# Altium footprint library Inductor.PcbLib: 39 footprints (part 1 of 3)
Each footprint in its own frame and in the unit in brackets; x right, y up, seen from the top. Pads: shape width x height; smd on the part's side, far side on the other; paste and mask are expansions set on the pad; w line width, h text height; cw(c..) or ccw(c..) is an arc to the next point about the centre after c.
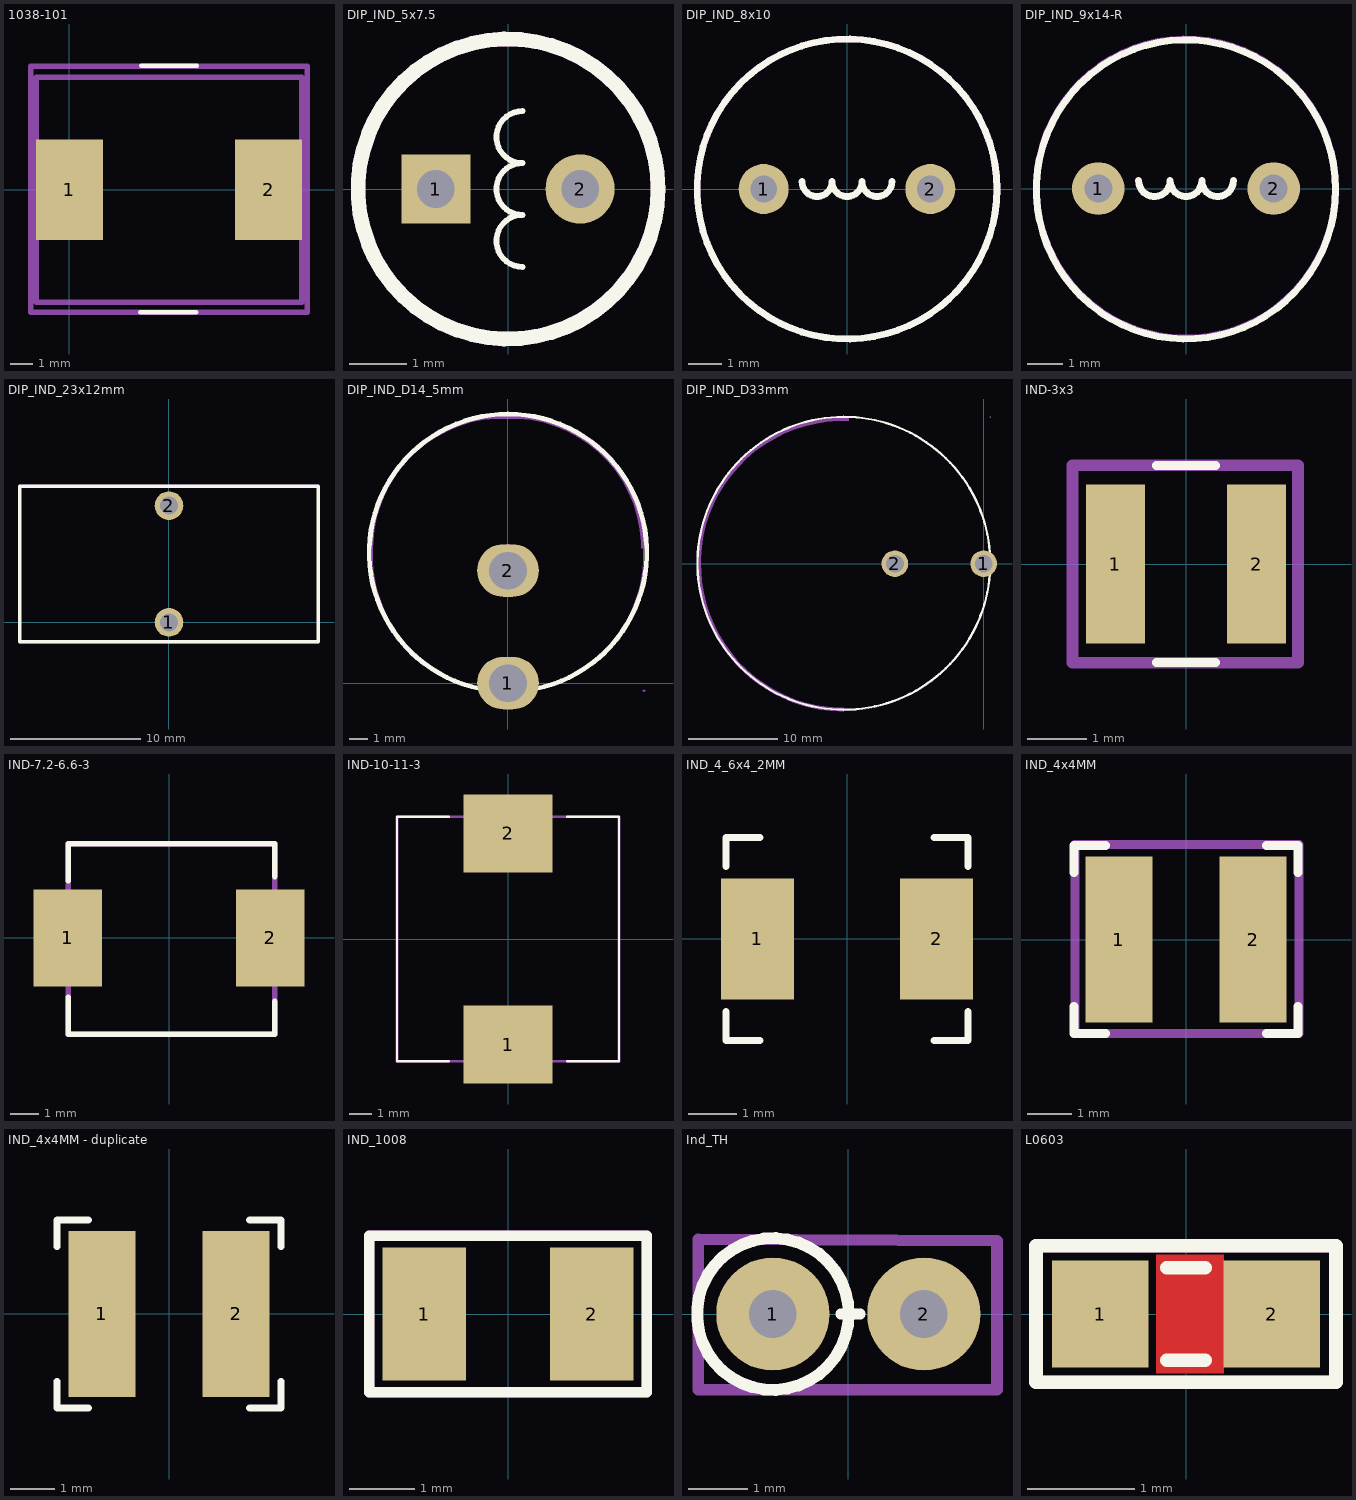
[diagram p0: the footprints below, top view; thin cyan lines are the x and y axes]

## 1038-101 [mm] "FIXED IND 1.5UH 4.2A 20.8 MOHM"
pads (2):
  rect 3x4.5 smd: 1(-0.001,0) 2(8.9,0)
Top Overlay:
  lines w0.2: 3.175,-5.475 5.675,-5.475 ; 3.2,5.55 5.7,5.55
Mechanical 13:
  lines w0.254: -1.725,-5.475 10.625,-5.475 10.625,5.525 -1.725,5.525 -1.725,-5.475
  text ".Designator" at -0.572,-0.635 h1.5
Mechanical 15:
  lines w0.254: -1.475,-5.025 10.375,-5.025 10.375,5.025 -1.475,5.025 -1.475,-5.025
  text ".Comment" at -0.572,-0.635 h1.5
3D body "SRP6540.stp": height 3.97, standoff -0.02, extent 0.731,-3.126 7.919,3.376

## DIP_IND_5x7.5 [mm]
height 8
pads (2):
  rect 1.2x1.2 hole 0.65: 1(-1.25,0)
  round 1.2 hole 0.65: 2(1.25,0)
Top Overlay:
  circle w0.254: c0,0 r2.6
  lines w0.1: 0.25,-1.35 cw(c0.249,-0.9) 0.25,-0.45 cw(c0.249,0) 0.25,0.45 cw(c0.249,0.9) 0.25,1.35
Mechanical 13:
  circle w0.254: c0,0 r2.6
  text ".Designator" at 0.204,-2.243 h1
Mechanical 15:
  circle w0.254: c0,0 r2.6
  text ".Comment" at 0.204,-2.116 h1
3D body "IND5x7.stp": height 7.5, standoff -28.5, extent -2.75,-2.75 2.75,2.75

## DIP_IND_8x10 [mm]
height 8
pads (2):
  round 1.5 hole 0.8: 1(-2.5,0) 2(2.5,0)
Top Overlay:
  circle w0.2: c0,0 r4.5
  lines w0.2: -1.35,0.225 ccw(c-0.9,0.224) -0.45,0.225 ccw(c0,0.224) 0.45,0.225 ccw(c0.9,0.224) 1.35,0.225
Mechanical 13:
  circle w0.2: c0,0 r4.5
  text ".Designator" at -3.725,-0.325 h1.5
Mechanical 15:
  circle w0.2: c0,0 r4.5
  text ".Comment" at -4.2,-0.45 h1.5
3D body: height 10, standoff 6.6, extent -4.49,-4.49 4.49,4.49
3D body: height 6.6, standoff 3.3, extent -3.903,-3.907 3.903,3.907
3D body: height 3.3, standoff 0, extent -4.49,-4.49 4.49,4.49

## DIP_IND_9x14-R [mm]
height 8
pads (2):
  round 1.5 hole 0.8: 1(-2.5,0) 2(2.5,0)
Top Overlay:
  circle w0.2: c0,-0.025 r4.264
  lines w0.2: -1.35,0.225 ccw(c-0.9,0.224) -0.45,0.225 ccw(c0,0.224) 0.45,0.225 ccw(c0.9,0.224) 1.35,0.225
Mechanical 13:
  circle w0.2: c0,0 r4.264
  text ".Designator" at -3.725,-0.325 h1.5
3D body "rlb0914.stp": height 11.14, standoff -21, extent -4.199,-4.146 4.195,4.25

## DIP_IND_23x12mm [mm]
pads (2):
  round 2.2 hole 1.4 paste+0 mask+0.05: 1(0,0) 2(0,9)
Top Overlay:
  lines w0.254: -11.5,-1.5 -11.5,10.5 11.5,10.5 11.5,-1.5 -11.5,-1.5
Mechanical 6:
  region: -11.43,10.596 -11.43,-1.469 11.43,-1.469 11.43,10.469 -11.303,10.469 -11.303,10.596 11.557,10.596 11.557,-1.596 -11.557,-1.596 -11.557,10.596
Mechanical 15:
  region: 11.56,-1.5 11.56,-1.475 11.525,-1.44 11.475,-1.44 11.44,-1.475 11.44,-1.5 11.44,-1.525 11.475,-1.56 11.525,-1.56 11.56,-1.525
  region: 0.6,9 0.599,9.118 0.507,9.337 0.338,9.504 0.119,9.594 -0.119,9.594 -0.338,9.504 -0.507,9.337 -0.599,9.119 -0.6,9 -0.599,8.881 -0.507,8.663 -0.338,8.496 -0.119,8.405 0.119,8.405 0.338,8.496 0.507,8.663 0.599,8.881
  region: 0.6,0 0.599,0.118 0.507,0.337 0.338,0.504 0.119,0.594 -0.119,0.594 -0.338,0.504 -0.507,0.337 -0.599,0.119 -0.6,0 -0.599,-0.119 -0.507,-0.337 -0.338,-0.504 -0.119,-0.595 0.119,-0.595 0.338,-0.504 0.507,-0.337 0.599,-0.119
  lines w0.051: -11.5,-1.5 -11.5,10.5 11.5,10.5 11.5,-1.5 -11.5,-1.5
3D body "3D.step": height 25.91, standoff -3.4, extent -11.392,-1.5 11.292,10.6

## DIP_IND_D14_5mm [mm]
pads (2):
  oval 3.3x2.8 hole 2 paste+0 mask+0.05: 1(0,0) 2(0,6)
Top Overlay:
  lines w0.254: -0.998,-0.387 cw(c0,6.945) 0.998,-0.387
Mechanical 6:
  region: 7.3,7.2 7.3,7.549 7.232,8.243 7.096,8.927 6.893,9.595 6.626,10.239 6.297,10.855 5.91,11.435 5.467,11.974 4.974,12.467 4.435,12.91 3.855,13.297 3.239,13.626 2.595,13.893 1.927,14.096 1.243,14.232 0.549,14.3 0.2,14.3 -0.3,14.3 -0.649,14.3 -1.343,14.232 -2.027,14.096 -2.695,13.893 -3.339,13.626 -3.955,13.297 -4.535,12.91 -5.074,12.467 -5.567,11.974 -6.01,11.435 -6.397,10.855 -6.726,10.239 -6.993,9.595 -7.196,8.927 -7.332,8.243 -7.4,7.549 -7.4,7.2 -7.2,7.2 -7.192,7.539 -7.125,8.212 -6.993,8.877 -6.797,9.525 -6.538,10.15 -6.218,10.747 -5.842,11.31 -5.413,11.834 -4.934,12.313 -4.41,12.742 -3.847,13.118 -3.25,13.438 -2.625,13.697 -1.977,13.893 -1.312,14.025 -0.639,14.092 -0.3,14.1 0.2,14.1 0.539,14.092 1.212,14.025 1.877,13.893 2.525,13.697 3.15,13.438 3.747,13.118 4.31,12.742 4.834,12.313 5.313,11.834 5.742,11.31 6.118,10.747 6.438,10.15 6.697,9.525 6.893,8.877 7.025,8.212 7.092,7.539 7.1,7.2
Mechanical 15:
  region: 0.4,0 0.398,0.079 0.336,0.223 0.224,0.333 0.079,0.393 -0.079,0.393 -0.224,0.333 -0.336,0.223 -0.398,0.079 -0.4,0 -0.398,-0.079 -0.336,-0.223 -0.224,-0.333 -0.078,-0.393 0.079,-0.393 0.224,-0.333 0.336,-0.223 0.399,-0.078
  region: 0.4,7 0.398,7.079 0.336,7.223 0.224,7.333 0.078,7.393 -0.079,7.393 -0.224,7.333 -0.337,7.223 -0.399,7.079 -0.4,7 -0.399,6.921 -0.336,6.777 -0.224,6.667 -0.079,6.607 0.079,6.607 0.224,6.667 0.336,6.777 0.398,6.922
  region: 7.311,-0.405 7.31,-0.381 7.275,-0.347 7.226,-0.347 7.191,-0.381 7.191,-0.405 7.191,-0.429 7.226,-0.463 7.275,-0.463 7.31,-0.429
  lines w0.051: -7.25,6.945 cw(c-0.001,7.045) 0,14.295 cw(c0.001,7.045) 7.25,6.945 cw(c0.001,6.845) 0,-0.405 cw(c-0.001,6.845) -7.25,6.945
3D body "3.step": height 9.55, standoff -2.9, extent -7.4,-0.325 7.3,14.385

## DIP_IND_D33mm [mm]
pads (2):
  round 3 hole 2 paste+0 mask+0.05: 1(0,0) 2(-10,0)
Top Overlay:
  lines w0.254: 0.7,-1.1 cw(c-15.755,0.05) 0.7,1.2
Mechanical 6:
  region: -31.85,-0.15 -31.838,-0.782 -31.738,-2.042 -31.541,-3.291 -31.245,-4.52 -30.855,-5.722 -30.371,-6.89 -29.797,-8.017 -29.137,-9.095 -28.394,-10.117 -27.573,-11.079 -26.679,-11.973 -25.717,-12.794 -24.695,-13.537 -23.617,-14.197 -22.49,-14.771 -21.322,-15.255 -20.12,-15.645 -18.891,-15.941 -17.642,-16.138 -16.382,-16.238 -15.75,-16.25 -15.75,-16.65 -16.29,-16.65 -17.368,-16.579 -18.439,-16.438 -19.499,-16.228 -20.542,-15.948 -21.565,-15.601 -22.563,-15.187 -23.532,-14.709 -24.468,-14.169 -25.366,-13.569 -26.223,-12.911 -27.035,-12.199 -27.799,-11.435 -28.511,-10.623 -29.169,-9.766 -29.769,-8.868 -30.309,-7.932 -30.787,-6.963 -31.201,-5.965 -31.548,-4.942 -31.828,-3.899 -32.038,-2.839 -32.179,-1.768 -32.25,-0.69 -32.25,-0.15 -32.25,0.45 -31.85,0.45
  region: -15.8,16.1 -16.432,16.088 -17.692,15.988 -18.941,15.791 -20.17,15.495 -21.372,15.105 -22.54,14.621 -23.667,14.047 -24.745,13.387 -25.767,12.644 -26.729,11.823 -27.623,10.929 -28.444,9.967 -29.187,8.945 -29.847,7.867 -30.421,6.74 -30.905,5.572 -31.295,4.37 -31.591,3.141 -31.788,1.892 -31.888,0.632 -31.9,0 -32.3,0 -32.3,0.54 -32.229,1.618 -32.088,2.689 -31.878,3.749 -31.598,4.792 -31.251,5.815 -30.837,6.813 -30.359,7.782 -29.819,8.718 -29.219,9.616 -28.561,10.473 -27.849,11.285 -27.085,12.049 -26.273,12.761 -25.416,13.419 -24.518,14.019 -23.582,14.559 -22.613,15.037 -21.615,15.451 -20.592,15.798 -19.549,16.078 -18.489,16.288 -17.418,16.429 -16.34,16.5 -15.8,16.5 -15.2,16.5 -15.2,16.1
Mechanical 15:
  region: 0.81,16.52 0.809,16.545 0.774,16.578 0.726,16.578 0.691,16.545 0.69,16.52 0.691,16.496 0.726,16.463 0.774,16.463 0.809,16.496
  region: -9.25,0 -9.25,0.099 -9.301,0.29 -9.4,0.461 -9.539,0.6 -9.711,0.699 -9.901,0.75 -10.099,0.75 -10.29,0.699 -10.461,0.6 -10.6,0.461 -10.699,0.29 -10.75,0.099 -10.75,0 -10.75,-0.099 -10.699,-0.29 -10.6,-0.461 -10.461,-0.6 -10.29,-0.699 -10.099,-0.75 -9.901,-0.75 -9.711,-0.699 -9.539,-0.6 -9.4,-0.461 -9.301,-0.29 -9.25,-0.099
  region: 0.75,0 0.75,0.099 0.699,0.29 0.6,0.461 0.461,0.6 0.289,0.699 0.099,0.75 -0.099,0.75 -0.29,0.699 -0.461,0.6 -0.6,0.461 -0.699,0.29 -0.75,0.099 -0.75,0 -0.75,-0.099 -0.699,-0.29 -0.6,-0.461 -0.461,-0.6 -0.29,-0.699 -0.099,-0.75 0.099,-0.75 0.289,-0.699 0.461,-0.6 0.6,-0.461 0.699,-0.29 0.75,-0.099
  lines w0.051: -32.25,0 ccw(c-15.75,-0.02) 0.75,0 ccw(c-15.75,0.02) -32.25,0
3D body "1.step": height 14.55, standoff 0.45, extent -33.35,-17.825 1.75,17.275

## IND-3x3 [mm]
pads (2):
  rect 1x2.692 smd paste+0 mask+0: 1(-1.2,0) 2(1.2,0)
Top Overlay:
  lines w0.152: -0.5,-1.675 0.5,-1.675 ; -0.5,1.675 0.5,1.675
Mechanical 13:
  lines w0.2: -1.925,-1.675 -1.925,1.675 1.9,1.675 1.9,-1.675 -1.925,-1.675
  text ".Designator" at 0.175,-1.35 h1.2
Mechanical 15:
  lines w0.2: -1.925,-1.675 1.9,-1.675 1.9,1.675 -1.925,1.675 -1.925,-1.675
  text ".Comment" at 0.175,-1.35 h1.2
3D body "IND_TAIYO_NRH3012.step": height 1.19, standoff 0, extent -1.549,-1.552 1.549,1.552

## IND-7.2-6.6-3 [mm]
pads (2):
  rect 2.4x3.4 smd: 1(-3.55,0) 2(3.55,0)
Top Overlay:
  lines w0.2: -3.525,-2.075 -3.525,-3.375 3.7,-3.375 3.7,-2.225 ; -3.525,2 -3.525,3.3 3.7,3.3 3.7,2.15
Mechanical 13:
  lines w0.2: -3.525,-3.375 -3.525,3.3 3.7,3.3 3.7,-3.375 -3.525,-3.375
  text ".Designator" at -2.6,-0.2 h1.2
Mechanical 15:
  lines w0.2: -3.525,-3.375 3.7,-3.375 3.7,3.3 -3.525,3.3 -3.525,-3.375
  text ".Comment" at -2.6,-0.2 h1.2
3D body "ASPI-0630HI.STEP": height 3.05, standoff 0.05, extent -3.6,-3.325 3.6,3.325

## IND-10-11-3 [mm]
pads (2):
  rect 4x3.5 smd: 1(0,-4.75) 2(0,4.75)
Top Overlay:
  lines w0.1: -2.65,-5.5 -5,-5.5 -5,5.5 -2.65,5.5 ; 2.65,-5.5 5,-5.5 5,5.5 2.65,5.5
Mechanical 13:
  lines w0.127: -5,-5.5 5,-5.5 5,5.5 -5,5.5 -5,-5.5
  text ".Designator" at -0.021,-2.368 h1
Mechanical 15:
  lines w0.127: -5,-5.5 -5,5.5 5,5.5 5,-5.5 -5,-5.5
  text ".Comment" at -0.021,-2.241 h1
3D body: height 2.9, standoff 0, extent -4.95,-5.5 5.025,5.5

## IND_4_6x4_2MM [mm] "SWPA4030S330MT"
pads (2):
  rect 1.5x2.5 smd: 1(-1.85,0) 2(1.85,0)
Top Overlay:
  lines w0.15: -2.5,-1.5 -2.5,-2.1 -1.8,-2.1 ; -2.5,1.5 -2.5,2.1 -1.8,2.1 ; 1.8,-2.1 2.5,-2.1 2.5,-1.5 ; 1.8,2.1 2.5,2.1 2.5,1.5
3D body "srn4018.stp": height 1.76, standoff 0.11, extent -2,-2 2,2

## IND_4x4MM [mm] "SWPA4030S330MT"
pads (2):
  rect 1.5x3.7 smd: 1(-1.5,0) 2(1.5,0)
Top Overlay:
  lines w0.2: -2.5,-1.5 -2.5,-2.1 -1.8,-2.1 ; -2.5,1.5 -2.5,2.1 -1.8,2.1 ; 1.8,-2.1 2.5,-2.1 2.5,-1.5 ; 1.8,2.1 2.5,2.1 2.5,1.5
Mechanical 13:
  lines w0.2: -2.475,-2.1 2.525,-2.1 2.525,2.125 -2.475,2.125 -2.475,-2.1
  text ".Designator" at -2.1,-0.625 h1.5
3D body "srn4018.stp": height 1.76, standoff 0.11, extent -2,-2 2,2

## IND_4x4MM - duplicate [mm] "SWPA4030S330MT"
pads (2):
  rect 1.5x3.7 smd: 1(-1.5,0) 2(1.5,0)
Top Overlay:
  lines w0.15: -2.5,-1.5 -2.5,-2.1 -1.8,-2.1 ; -2.5,1.5 -2.5,2.1 -1.8,2.1 ; 1.8,-2.1 2.5,-2.1 2.5,-1.5 ; 1.8,2.1 2.5,2.1 2.5,1.5
3D body "srn4018.stp": height 1.76, standoff 0.11, extent -2,-2 2,2

## IND_1008 [mm]
pads (2):
  rect 1.28x2.03 smd: 1(-1.28,0) 2(1.28,0)
Top Overlay:
  lines w0.16: -2.125,-1.2 -2.125,1.2 2.125,1.2 2.125,-1.2 -2.125,-1.2
Mechanical 13:
  lines w0.16: -2.125,-1.2 -2.125,1.2 2.125,1.2 2.125,-1.2 -2.125,-1.2
  text ".Designator" at -1.65,-0.341 h1.5
3D body "IND_1008.step": height 1.8, standoff 0, extent -1.25,-1 1.25,1

## Ind_TH [mm]
height 2.54
pads (2):
  round 1.905 hole 0.8: 1(-1.27,0) 2(1.27,0)
Top Overlay:
  circle w0.2: c-1.27,0 r1.276
  lines w0.178: -0.127,0 0.203,0
Mechanical 13:
  lines w0.2: -2.525,-1.275 -2.525,1.258 2.5,1.233 2.5,-1.275 -2.525,-1.275
  text ".Designator" at -2.175,-0.1 h1
3D body "SW3dPS-Res_Stand.STEP": height 7.3, standoff -1.45, extent -2.159,-0.92 1.553,0.92

## L0603 [mm]
pads (2):
  rect 0.9x1 smd: 1(-0.8,0) 2(0.8,0)
Top Layer:
  pour cut-out: -0.275,0.55 -0.275,-0.55 0.35,-0.55 0.35,0.55
Top Overlay:
  lines w0.127: -0.178,-0.432 0.178,-0.432 ; -0.178,0.432 0.178,0.432 ; -1.397,-0.635 -1.397,0.635 1.397,0.635 1.397,-0.635 -1.397,-0.635
Mechanical 13:
  lines w0.127: -1.397,-0.635 -1.397,0.635 1.397,0.635 1.397,-0.635 -1.397,-0.635
  text ".Designator" at -1.143,-0.254 h1
Mechanical 15:
  lines w0.127: -1.397,-0.635 1.397,-0.635 1.397,0.635 -1.397,0.635 -1.397,-0.635
  text ".Comment" at -1.016,-0.254 h1
3D body "C0603X473K5RACTU.step": height 0.9, standoff -0.05, extent -0.935,-0.45 0.835,0.5